# Altium footprint library Standard2.PcbLib: 423 footprints (part 1 of 27)
Each footprint in its own frame and in the unit in brackets; x right, y up, seen from the top. Pads: shape width x height; smd on the part's side, far side on the other; paste and mask are expansions set on the pad; w line width, h text height; cw(c..) or ccw(c..) is an arc to the next point about the centre after c.
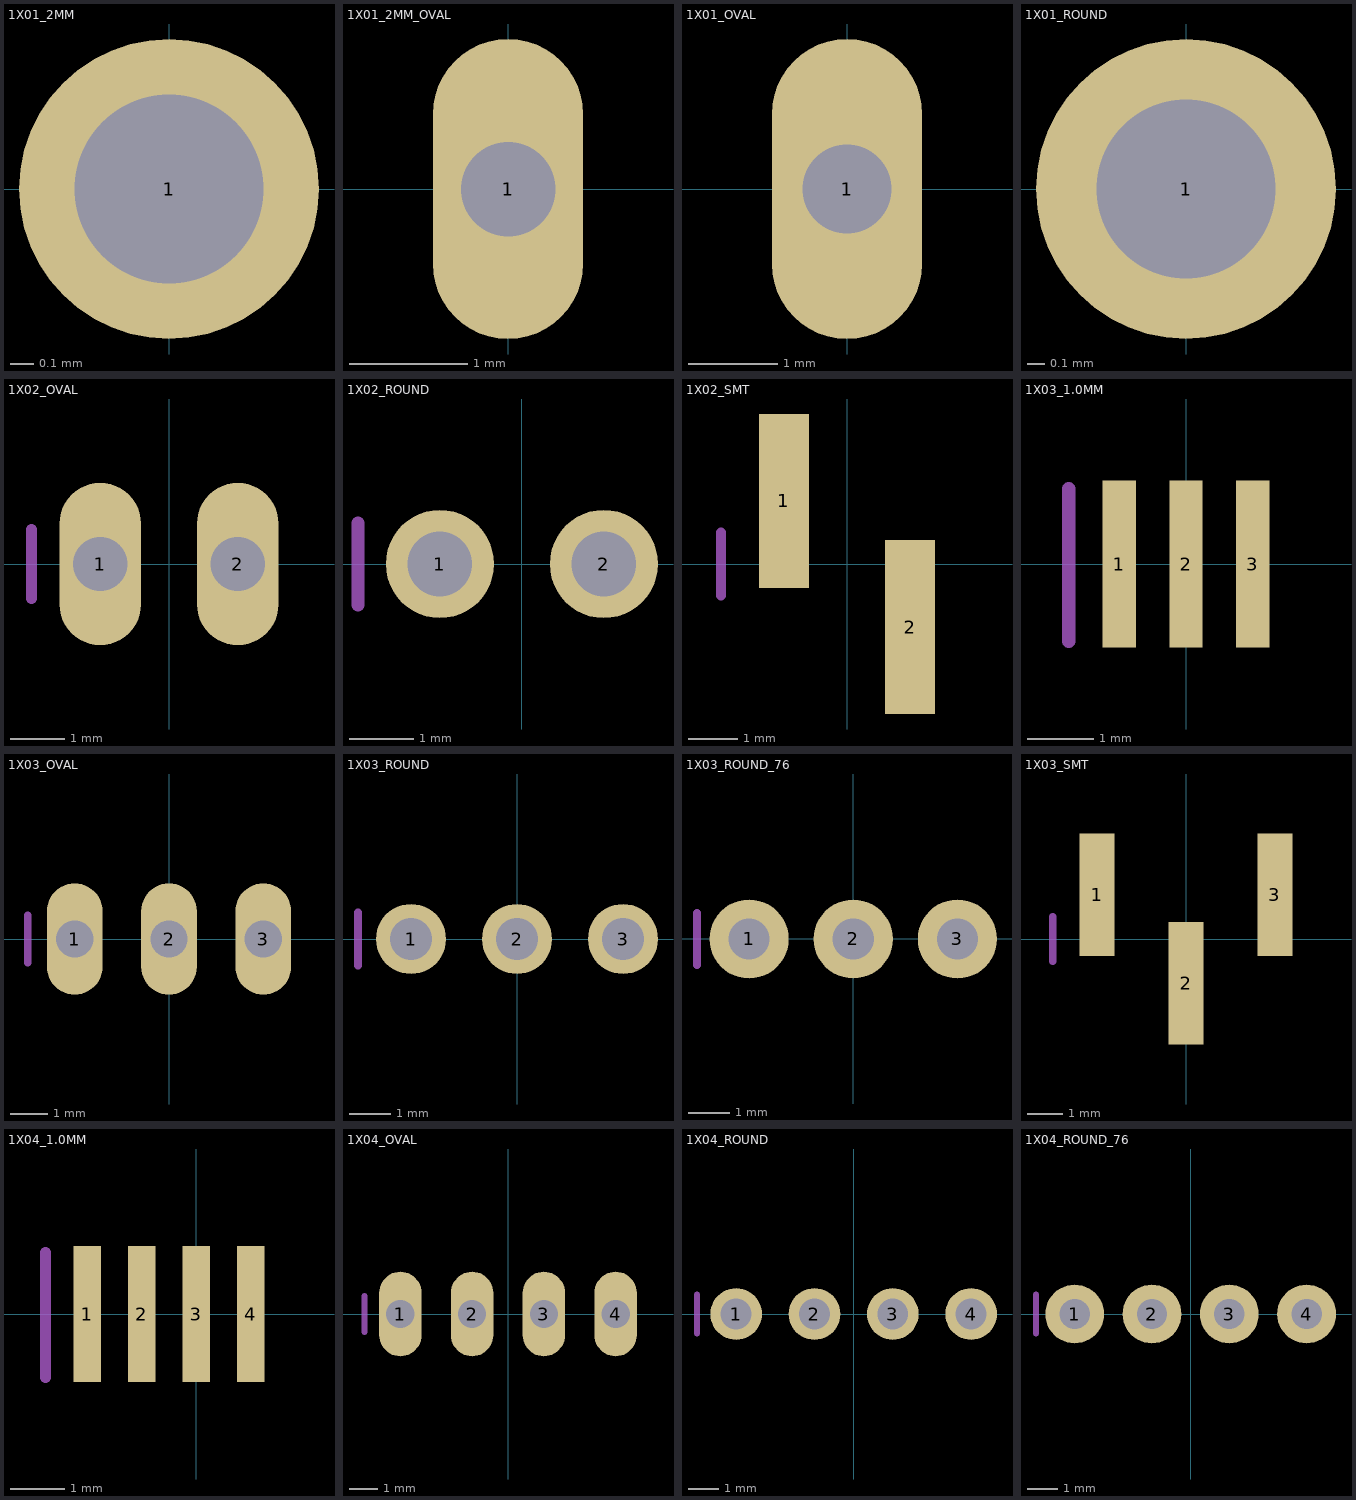
[diagram p0: the footprints below, top view; thin cyan lines are the x and y axes]

## 1X01_2MM [mil]
pads (1):
  round 50 hole 31.5: 1(0,0)
Mechanical 18:
  rectangle: -10,-10 10,10

## 1X01_2MM_OVAL [mil]
pads (1):
  oval 50x100 hole 31.5: 1(0,0)
Mechanical 18:
  rectangle: -10,-10 10,10

## 1X01_OVAL [mil]
pads (1):
  oval 66x132 hole 39.37: 1(0,0)
Mechanical 18:
  rectangle: -10,-10 10,10

## 1X01_ROUND [mil]
pads (1):
  round 66 hole 39.37: 1(0,0)
Mechanical 18:
  rectangle: -10,-10 10,10

## 1X02_OVAL [mm]
pads (2):
  oval 1.5x3 hole 1: 1(-1.27,0) 2(1.27,0)
Mechanical 18:
  rectangle: -1.524,-0.254 -1.016,0.254
  rectangle: 1.016,-0.254 1.524,0.254
  lines w0.203: -2.54,-0.635 -2.54,0.635

## 1X02_ROUND [mil]
pads (2):
  round 66 hole 39.37: 1(-50,0) 2(50,0)
Mechanical 18:
  rectangle: -60,-10 -40,10
  rectangle: 40,-10 60,10
  lines w8: -100,-25 -100,25

## 1X02_SMT [mm]
pads (2):
  rect 1x3.5 smd: 1(-1.27,1.27) 2(1.27,-1.27)
Mechanical 18:
  lines w0.203: -2.54,-0.635 -2.54,0.635

## 1X03_1.0MM [mm]
pads (3):
  rect 0.5x2.5 smd: 1(-1,0) 2(0,0) 3(1,0)
Mechanical 2:
  lines w0.203: -1.762,-1.159 -1.762,1.127

## 1X03_OVAL [mm]
pads (3):
  oval 1.5x3 hole 1: 1(-2.54,0) 2(0,0) 3(2.54,0)
Mechanical 18:
  rectangle: -0.254,-0.254 0.254,0.254
  rectangle: -2.794,-0.254 -2.286,0.254
  rectangle: 2.286,-0.254 2.794,0.254
  lines w0.203: -3.81,-0.635 -3.81,0.635

## 1X03_ROUND [mil]
pads (3):
  round 66 hole 39.37: 1(-100,0) 2(0,0) 3(100,0)
Mechanical 18:
  rectangle: -10,-10 10,10
  rectangle: -110,-10 -90,10
  rectangle: 90,-10 110,10
  lines w8: -150,-25 -150,25

## 1X03_ROUND_76 [mil]
pads (3):
  round 76 hole 39.37: 1(-100,0) 2(0,0) 3(100,0)
Mechanical 18:
  rectangle: -10,-10 10,10
  rectangle: -110,-10 -90,10
  rectangle: 90,-10 110,10
  lines w8: -150,-25 -150,25

## 1X03_SMT [mm]
pads (3):
  rect 1x3.5 smd: 1(-2.54,1.27) 2(0,-1.27) 3(2.54,1.27)
Mechanical 18:
  lines w0.203: -3.81,-0.635 -3.81,0.635

## 1X04_1.0MM [mm]
pads (4):
  rect 0.5x2.5 smd: 1(-2,0) 2(-1,0) 3(0,0) 4(1,0)
Mechanical 2:
  lines w0.203: -2.762,-1.159 -2.762,1.127

## 1X04_OVAL [mm]
pads (4):
  oval 1.5x3 hole 1: 1(-3.81,0) 2(-1.27,0) 3(1.27,0) 4(3.81,0)
Mechanical 18:
  rectangle: 1.016,-0.254 1.524,0.254
  rectangle: -1.524,-0.254 -1.016,0.254
  rectangle: -4.064,-0.254 -3.556,0.254
  rectangle: 3.556,-0.254 4.064,0.254
  lines w0.203: -5.08,-0.635 -5.08,0.635

## 1X04_ROUND [mil]
pads (4):
  round 66 hole 39.37: 1(-150,0) 2(-50,0) 3(50,0) 4(150,0)
Mechanical 18:
  rectangle: 40,-10 60,10
  rectangle: -60,-10 -40,10
  rectangle: -160,-10 -140,10
  rectangle: 140,-10 160,10
  lines w8: -200,-25 -200,25

## 1X04_ROUND_76 [mil]
pads (4):
  round 76 hole 39.37: 1(-150,0) 2(-50,0) 3(50,0) 4(150,0)
Mechanical 18:
  rectangle: 40,-10 60,10
  rectangle: -60,-10 -40,10
  rectangle: -160,-10 -140,10
  rectangle: 140,-10 160,10
  lines w8: -200,-25 -200,25